# Altium schematic symbol library jlcpcb_2025_04_inductors_extended_0402.schlib: 1396 symbols (part 2 of 8)
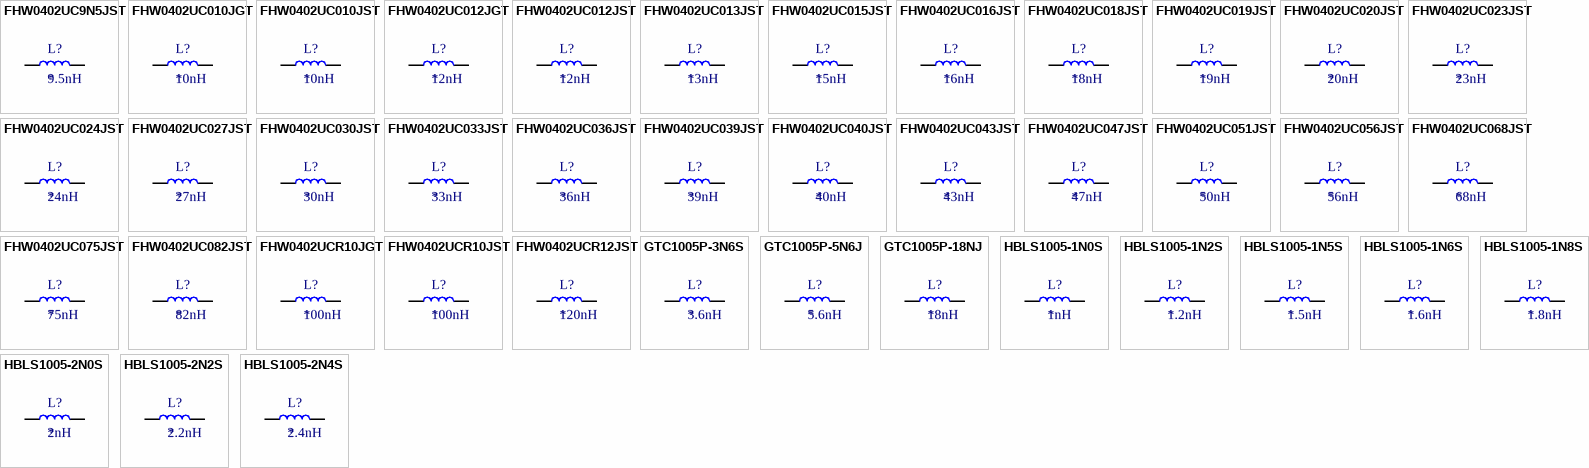
[diagram p35: symbols FHW0402UC9N5JST to HBLS1005-2N4S]

## FHW0402UC051JST
designator L?  Inductance: 50nH
Inductor, 50nH, ±5%, 820mΩ, 100mA, SMD 0402; Manufacturer: FH(Guangdong Fenghua Advanced Tech); Manufacturer Part Number: FHW0402UC051JST; Self-Resonant Frequency: 1.75GHz; Q Factor: 25@250MHz; Package Size: 0402; JLCPCB Basic Part: No; JLCPCB Part Number: C317970; Supplier 1: LCSC; Category: Inductors; Supplier Part Number 1: C317970; Tolerance: ±5%; Rated Current: 100mA; DC Resistance: 820mΩ; RoHS: Yes; ComponentLink1Description: Datasheet; ComponentLink1URL: https://wmsc.lcsc.com/wmsc/upload/file/pdf/v2/lcsc/2302231208_FH--Guangdong-Fenghua-Advanced-Tech-FHW0402UC051JST_C317970.pdf; ComponentLink2Description: JLCPCB Part URL; ComponentLink2URL: https://jlcpcb.com/partdetail/C317970; ComponentLink3Description: LCSC Part URL; ComponentLink3URL: https://lcsc.com/product-detail/Inductors-SMD_FH-Guangdong-Fenghua-Advanced-Tech-FH-Guangdong-Fenghua-Advanced-Tech-FHW0402UC051JST_C317970.html
footprint IND-0402 (0402 (1005M) Inductor)
pins: 1, 2

## FHW0402UC056JST
designator L?  Inductance: 56nH
Inductor, 56nH, ±5%, 970mΩ, 100mA, SMD 0402; Manufacturer: FH(Guangdong Fenghua Advanced Tech); Manufacturer Part Number: FHW0402UC056JST; Self-Resonant Frequency: 1.76GHz; Q Factor: 25@250MHz; Package Size: 0402; JLCPCB Basic Part: No; JLCPCB Part Number: C317971; Supplier 1: LCSC; Category: Inductors; Supplier Part Number 1: C317971; Tolerance: ±5%; Rated Current: 100mA; DC Resistance: 970mΩ; RoHS: Yes; ComponentLink1Description: Datasheet; ComponentLink1URL: https://wmsc.lcsc.com/wmsc/upload/file/pdf/v2/lcsc/2302231208_FH--Guangdong-Fenghua-Advanced-Tech-FHW0402UC056JST_C317971.pdf; ComponentLink2Description: JLCPCB Part URL; ComponentLink2URL: https://jlcpcb.com/partdetail/C317971; ComponentLink3Description: LCSC Part URL; ComponentLink3URL: https://lcsc.com/product-detail/Inductors-SMD_FH-Guangdong-Fenghua-Advanced-Tech-FH-Guangdong-Fenghua-Advanced-Tech-FHW0402UC056JST_C317971.html
footprint IND-0402 (0402 (1005M) Inductor)
pins: 1, 2

## FHW0402UC068JST
designator L?  Inductance: 68nH
Inductor, 68nH, ±5%, 1.12Ω, 100mA, SMD 0402; Manufacturer: FH(Guangdong Fenghua Advanced Tech); Manufacturer Part Number: FHW0402UC068JST; Self-Resonant Frequency: 1.62GHz; Q Factor: 25@250MHz; Package Size: 0402; JLCPCB Basic Part: No; JLCPCB Part Number: C317973; Supplier 1: LCSC; Category: Inductors; Supplier Part Number 1: C317973; Tolerance: ±5%; Rated Current: 100mA; DC Resistance: 1.12Ω; RoHS: Yes; ComponentLink1Description: Datasheet; ComponentLink1URL: https://wmsc.lcsc.com/wmsc/upload/file/pdf/v2/lcsc/2302231208_FH--Guangdong-Fenghua-Advanced-Tech-FHW0402UC068JST_C317973.pdf; ComponentLink2Description: JLCPCB Part URL; ComponentLink2URL: https://jlcpcb.com/partdetail/C317973; ComponentLink3Description: LCSC Part URL; ComponentLink3URL: https://lcsc.com/product-detail/Inductors-SMD_FH-Guangdong-Fenghua-Advanced-Tech-FH-Guangdong-Fenghua-Advanced-Tech-FHW0402UC068JST_C317973.html
footprint IND-0402 (0402 (1005M) Inductor)
pins: 1, 2

## FHW0402UC075JST
designator L?  Inductance: 75nH
Inductor, 75nH, ±5%, 1.63Ω, 50mA, SMD 0402; Manufacturer: FH(Guangdong Fenghua Advanced Tech); Manufacturer Part Number: FHW0402UC075JST; Self-Resonant Frequency: 1.4GHz; Q Factor: 25@250MHz; Package Size: 0402; JLCPCB Basic Part: No; JLCPCB Part Number: C317974; Supplier 1: LCSC; Category: Inductors; Supplier Part Number 1: C317974; Tolerance: ±5%; Rated Current: 50mA; DC Resistance: 1.63Ω; RoHS: Yes; ComponentLink1Description: Datasheet; ComponentLink1URL: https://wmsc.lcsc.com/wmsc/upload/file/pdf/v2/lcsc/2302231208_FH--Guangdong-Fenghua-Advanced-Tech-FHW0402UC075JST_C317974.pdf; ComponentLink2Description: JLCPCB Part URL; ComponentLink2URL: https://jlcpcb.com/partdetail/C317974; ComponentLink3Description: LCSC Part URL; ComponentLink3URL: https://lcsc.com/product-detail/Inductors-SMD_FH-Guangdong-Fenghua-Advanced-Tech-FH-Guangdong-Fenghua-Advanced-Tech-FHW0402UC075JST_C317974.html
footprint IND-0402 (0402 (1005M) Inductor)
pins: 1, 2

## FHW0402UC082JST
designator L?  Inductance: 82nH
Inductor, 82nH, ±5%, 1.7Ω, 50mA, SMD 0402; Manufacturer: FH(Guangdong Fenghua Advanced Tech); Manufacturer Part Number: FHW0402UC082JST; Self-Resonant Frequency: 1.26GHz; Q Factor: 25@250MHz; Package Size: 0402; JLCPCB Basic Part: No; JLCPCB Part Number: C317975; Supplier 1: LCSC; Category: Inductors; Supplier Part Number 1: C317975; Tolerance: ±5%; Rated Current: 50mA; DC Resistance: 1.7Ω; RoHS: Yes; ComponentLink1Description: Datasheet; ComponentLink1URL: https://wmsc.lcsc.com/wmsc/upload/file/pdf/v2/lcsc/2302231208_FH--Guangdong-Fenghua-Advanced-Tech-FHW0402UC082JST_C317975.pdf; ComponentLink2Description: JLCPCB Part URL; ComponentLink2URL: https://jlcpcb.com/partdetail/C317975; ComponentLink3Description: LCSC Part URL; ComponentLink3URL: https://lcsc.com/product-detail/Inductors-SMD_FH-Guangdong-Fenghua-Advanced-Tech-FH-Guangdong-Fenghua-Advanced-Tech-FHW0402UC082JST_C317975.html
footprint IND-0402 (0402 (1005M) Inductor)
pins: 1, 2

## FHW0402UCR10JGT
designator L?  Inductance: 100nH
Inductor, 100nH, ±5%, 2Ω, 30mA, SMD 0402; Manufacturer: FH(Guangdong Fenghua Advanced Tech); Manufacturer Part Number: FHW0402UCR10JGT; Self-Resonant Frequency: 1.16GHz; Q Factor: 25@250MHz; Package Size: 0402; JLCPCB Basic Part: No; JLCPCB Part Number: C316440; Supplier 1: LCSC; Category: Inductors; Supplier Part Number 1: C316440; Tolerance: ±5%; Rated Current: 30mA; DC Resistance: 2Ω; RoHS: Yes; ComponentLink1Description: Datasheet; ComponentLink1URL: https://wmsc.lcsc.com/wmsc/upload/file/pdf/v2/lcsc/2110111630_FH--Guangdong-Fenghua-Advanced-Tech-FHW0402UCR10JGT_C316440.pdf; ComponentLink2Description: JLCPCB Part URL; ComponentLink2URL: https://jlcpcb.com/partdetail/C316440; ComponentLink3Description: LCSC Part URL; ComponentLink3URL: https://lcsc.com/product-detail/Inductors-SMD_FH-Guangdong-Fenghua-Advanced-Tech-FH-Guangdong-Fenghua-Advanced-Tech-FHW0402UCR10JGT_C316440.html
footprint IND-0402 (0402 (1005M) Inductor)
pins: 1, 2

## FHW0402UCR10JST
designator L?  Inductance: 100nH
Inductor, 100nH, ±5%, 2Ω, 30mA, SMD 0402; Manufacturer: FH(Guangdong Fenghua Advanced Tech); Manufacturer Part Number: FHW0402UCR10JST; Self-Resonant Frequency: 1.16GHz; Q Factor: 25@250MHz; Package Size: 0402; JLCPCB Basic Part: No; JLCPCB Part Number: C317976; Supplier 1: LCSC; Category: Inductors; Supplier Part Number 1: C317976; Tolerance: ±5%; Rated Current: 30mA; DC Resistance: 2Ω; RoHS: Yes; ComponentLink1Description: Datasheet; ComponentLink1URL: https://wmsc.lcsc.com/wmsc/upload/file/pdf/v2/lcsc/2302231208_FH--Guangdong-Fenghua-Advanced-Tech-FHW0402UCR10JST_C317976.pdf; ComponentLink2Description: JLCPCB Part URL; ComponentLink2URL: https://jlcpcb.com/partdetail/C317976; ComponentLink3Description: LCSC Part URL; ComponentLink3URL: https://lcsc.com/product-detail/Inductors-SMD_FH-Guangdong-Fenghua-Advanced-Tech-FH-Guangdong-Fenghua-Advanced-Tech-FHW0402UCR10JST_C317976.html
footprint IND-0402 (0402 (1005M) Inductor)
pins: 1, 2

## FHW0402UCR12JST
designator L?  Inductance: 120nH
Inductor, 120nH, ±5%, 2.2Ω, 30mA, SMD 0402; Manufacturer: FH(Guangdong Fenghua Advanced Tech); Manufacturer Part Number: FHW0402UCR12JST; Self-Resonant Frequency: 1.1GHz; Q Factor: 25@250MHz; Package Size: 0402; JLCPCB Basic Part: No; JLCPCB Part Number: C317977; Supplier 1: LCSC; Category: Inductors; Supplier Part Number 1: C317977; Tolerance: ±5%; Rated Current: 30mA; DC Resistance: 2.2Ω; RoHS: Yes; ComponentLink1Description: Datasheet; ComponentLink1URL: https://wmsc.lcsc.com/wmsc/upload/file/pdf/v2/lcsc/2302231208_FH--Guangdong-Fenghua-Advanced-Tech-FHW0402UCR12JST_C317977.pdf; ComponentLink2Description: JLCPCB Part URL; ComponentLink2URL: https://jlcpcb.com/partdetail/C317977; ComponentLink3Description: LCSC Part URL; ComponentLink3URL: https://lcsc.com/product-detail/Inductors-SMD_FH-Guangdong-Fenghua-Advanced-Tech-FH-Guangdong-Fenghua-Advanced-Tech-FHW0402UCR12JST_C317977.html
footprint IND-0402 (0402 (1005M) Inductor)
pins: 1, 2

## GTC1005P-3N6S
designator L?  Inductance: 3.6nH
Inductor, 3.6nH, SMD 0402; Manufacturer: Gotrend Tech; Manufacturer Part Number: GTC1005P-3N6S; Package Size: 0402; JLCPCB Basic Part: No; JLCPCB Part Number: C226146; Supplier 1: LCSC; Category: Inductors; Supplier Part Number 1: C226146; RoHS: Yes; ComponentLink1Description: Datasheet; ComponentLink1URL: https://wmsc.lcsc.com/wmsc/upload/file/pdf/v2/lcsc/1809211933_Gotrend-Tech-GTC1005P-3N6S_C226146.pdf; ComponentLink2Description: JLCPCB Part URL; ComponentLink2URL: https://jlcpcb.com/partdetail/C226146; ComponentLink3Description: LCSC Part URL; ComponentLink3URL: https://lcsc.com/product-detail/Inductors-SMD_Gotrend-Tech-Gotrend-Tech-GTC1005P-3N6S_C226146.html
footprint IND-0402 (0402 (1005M) Inductor)
pins: 1, 2

## GTC1005P-5N6J
designator L?  Inductance: 5.6nH
Inductor, 5.6nH, ±5%, 230mΩ, 300mA, SMD 0402; Manufacturer: Gotrend Tech; Manufacturer Part Number: GTC1005P-5N6J; Package Size: 0402; JLCPCB Basic Part: No; JLCPCB Part Number: C226145; Supplier 1: LCSC; Category: Inductors; Supplier Part Number 1: C226145; Tolerance: ±5%; Rated Current: 300mA; DC Resistance: 230mΩ; RoHS: Yes; ComponentLink1Description: Datasheet; ComponentLink1URL: https://wmsc.lcsc.com/wmsc/upload/file/pdf/v2/lcsc/1809211933_Gotrend-Tech-GTC1005P-5N6J_C226145.pdf; ComponentLink2Description: JLCPCB Part URL; ComponentLink2URL: https://jlcpcb.com/partdetail/C226145; ComponentLink3Description: LCSC Part URL; ComponentLink3URL: https://lcsc.com/product-detail/Inductors-SMD_Gotrend-Tech-Gotrend-Tech-GTC1005P-5N6J_C226145.html
footprint IND-0402 (0402 (1005M) Inductor)
pins: 1, 2

## GTC1005P-18NJ
designator L?  Inductance: 18nH
Inductor, 18nH, ±5%, 550mΩ, 200mA, SMD 0402; Manufacturer: Gotrend Tech; Manufacturer Part Number: GTC1005P-18NJ; Package Size: 0402; JLCPCB Basic Part: No; JLCPCB Part Number: C226159; Supplier 1: LCSC; Category: Inductors; Supplier Part Number 1: C226159; Tolerance: ±5%; Rated Current: 200mA; DC Resistance: 550mΩ; RoHS: Yes; ComponentLink1Description: Datasheet; ComponentLink1URL: https://wmsc.lcsc.com/wmsc/upload/file/pdf/v2/lcsc/1808311639_Gotrend-Tech-GTC1005P-18NJ_C226159.pdf; ComponentLink2Description: JLCPCB Part URL; ComponentLink2URL: https://jlcpcb.com/partdetail/C226159; ComponentLink3Description: LCSC Part URL; ComponentLink3URL: https://lcsc.com/product-detail/Inductors-SMD_Gotrend-Tech-Gotrend-Tech-GTC1005P-18NJ_C226159.html
footprint IND-0402 (0402 (1005M) Inductor)
pins: 1, 2

## HBLS1005-1N0S
designator L?  Inductance: 1nH
Inductor, 1nH, 0.1Ω, 400mA, SMD 0402; Manufacturer: HYHONGYEX; Manufacturer Part Number: HBLS1005-1N0S; Self-Resonant Frequency: 10GHz; Q Factor: 8@100MHz; Package Size: 0402; JLCPCB Basic Part: No; JLCPCB Part Number: C963971; Supplier 1: LCSC; Category: Inductors; Supplier Part Number 1: C963971; Rated Current: 400mA; DC Resistance: 0.1Ω; RoHS: Yes; ComponentLink1Description: Datasheet; ComponentLink1URL: https://wmsc.lcsc.com/wmsc/upload/file/pdf/v2/lcsc/2012171915_HYHONGYEX-HBLS1005-1N0S_C963971.pdf; ComponentLink2Description: JLCPCB Part URL; ComponentLink2URL: https://jlcpcb.com/partdetail/C963971; ComponentLink3Description: LCSC Part URL; ComponentLink3URL: https://lcsc.com/product-detail/Inductors-SMD_HYHONGYEX-HYHONGYEX-HBLS1005-1N0S_C963971.html
footprint IND-0402 (0402 (1005M) Inductor)
pins: 1, 2

## HBLS1005-1N2S
designator L?  Inductance: 1.2nH
Inductor, 1.2nH, 0.1Ω, 400mA, SMD 0402; Manufacturer: HYHONGYEX; Manufacturer Part Number: HBLS1005-1N2S; Self-Resonant Frequency: 10GHz; Q Factor: 8@100MHz; Package Size: 0402; JLCPCB Basic Part: No; JLCPCB Part Number: C963973; Supplier 1: LCSC; Category: Inductors; Supplier Part Number 1: C963973; Rated Current: 400mA; DC Resistance: 0.1Ω; RoHS: Yes; ComponentLink1Description: Datasheet; ComponentLink1URL: https://wmsc.lcsc.com/wmsc/upload/file/pdf/v2/lcsc/2012171915_HYHONGYEX-HBLS1005-1N2S_C963973.pdf; ComponentLink2Description: JLCPCB Part URL; ComponentLink2URL: https://jlcpcb.com/partdetail/C963973; ComponentLink3Description: LCSC Part URL; ComponentLink3URL: https://lcsc.com/product-detail/Inductors-SMD_HYHONGYEX-HYHONGYEX-HBLS1005-1N2S_C963973.html
footprint IND-0402 (0402 (1005M) Inductor)
pins: 1, 2

## HBLS1005-1N5S
designator L?  Inductance: 1.5nH
Inductor, 1.5nH, 0.1Ω, 300mA, SMD 0402; Manufacturer: HYHONGYEX; Manufacturer Part Number: HBLS1005-1N5S; Self-Resonant Frequency: 6GHz; Q Factor: 8@100MHz; Package Size: 0402; JLCPCB Basic Part: No; JLCPCB Part Number: C963975; Supplier 1: LCSC; Category: Inductors; Supplier Part Number 1: C963975; Rated Current: 300mA; DC Resistance: 0.1Ω; RoHS: Yes; ComponentLink1Description: Datasheet; ComponentLink1URL: https://wmsc.lcsc.com/wmsc/upload/file/pdf/v2/lcsc/2012171915_HYHONGYEX-HBLS1005-1N5S_C963975.pdf; ComponentLink2Description: JLCPCB Part URL; ComponentLink2URL: https://jlcpcb.com/partdetail/C963975; ComponentLink3Description: LCSC Part URL; ComponentLink3URL: https://lcsc.com/product-detail/Inductors-SMD_HYHONGYEX-HYHONGYEX-HBLS1005-1N5S_C963975.html
footprint IND-0402 (0402 (1005M) Inductor)
pins: 1, 2

## HBLS1005-1N6S
designator L?  Inductance: 1.6nH
Inductor, 1.6nH, 0.1Ω, 300mA, SMD 0402; Manufacturer: HYHONGYEX; Manufacturer Part Number: HBLS1005-1N6S; Package Size: 0402; JLCPCB Basic Part: No; JLCPCB Part Number: C963976; Supplier 1: LCSC; Category: Inductors; Supplier Part Number 1: C963976; Rated Current: 300mA; DC Resistance: 0.1Ω; RoHS: Yes; ComponentLink1Description: Datasheet; ComponentLink1URL: https://wmsc.lcsc.com/wmsc/upload/file/pdf/v2/lcsc/2206142015_HYHONGYEX-HBLS1005-1N6S_C963976.pdf; ComponentLink2Description: JLCPCB Part URL; ComponentLink2URL: https://jlcpcb.com/partdetail/C963976; ComponentLink3Description: LCSC Part URL; ComponentLink3URL: https://lcsc.com/product-detail/Inductors-SMD_HYHONGYEX-HYHONGYEX-HBLS1005-1N6S_C963976.html
footprint IND-0402 (0402 (1005M) Inductor)
pins: 1, 2

## HBLS1005-1N8S
designator L?  Inductance: 1.8nH
Inductor, 1.8nH, 0.1Ω, 300mA, SMD 0402; Manufacturer: HYHONGYEX; Manufacturer Part Number: HBLS1005-1N8S; Self-Resonant Frequency: 6GHz; Q Factor: 8@100MHz; Package Size: 0402; JLCPCB Basic Part: No; JLCPCB Part Number: C963977; Supplier 1: LCSC; Category: Inductors; Supplier Part Number 1: C963977; Rated Current: 300mA; DC Resistance: 0.1Ω; RoHS: Yes; ComponentLink1Description: Datasheet; ComponentLink1URL: https://wmsc.lcsc.com/wmsc/upload/file/pdf/v2/lcsc/2012171915_HYHONGYEX-HBLS1005-1N8S_C963977.pdf; ComponentLink2Description: JLCPCB Part URL; ComponentLink2URL: https://jlcpcb.com/partdetail/C963977; ComponentLink3Description: LCSC Part URL; ComponentLink3URL: https://lcsc.com/product-detail/Inductors-SMD_HYHONGYEX-HYHONGYEX-HBLS1005-1N8S_C963977.html
footprint IND-0402 (0402 (1005M) Inductor)
pins: 1, 2

## HBLS1005-2N0S
designator L?  Inductance: 2nH
Inductor, 2nH, 0.2Ω, 300mA, SMD 0402; Manufacturer: HYHONGYEX; Manufacturer Part Number: HBLS1005-2N0S; Self-Resonant Frequency: 6GHz; Q Factor: 8@100MHz; Package Size: 0402; JLCPCB Basic Part: No; JLCPCB Part Number: C963978; Supplier 1: LCSC; Category: Inductors; Supplier Part Number 1: C963978; Rated Current: 300mA; DC Resistance: 0.2Ω; RoHS: Yes; ComponentLink1Description: Datasheet; ComponentLink1URL: https://wmsc.lcsc.com/wmsc/upload/file/pdf/v2/lcsc/2012171915_HYHONGYEX-HBLS1005-2N0S_C963978.pdf; ComponentLink2Description: JLCPCB Part URL; ComponentLink2URL: https://jlcpcb.com/partdetail/C963978; ComponentLink3Description: LCSC Part URL; ComponentLink3URL: https://lcsc.com/product-detail/Inductors-SMD_HYHONGYEX-HYHONGYEX-HBLS1005-2N0S_C963978.html
footprint IND-0402 (0402 (1005M) Inductor)
pins: 1, 2

## HBLS1005-2N2S
designator L?  Inductance: 2.2nH
Inductor, 2.2nH, 0.2Ω, 300mA, SMD 0402; Manufacturer: HYHONGYEX; Manufacturer Part Number: HBLS1005-2N2S; Self-Resonant Frequency: 6GHz; Q Factor: 8@100MHz; Package Size: 0402; JLCPCB Basic Part: No; JLCPCB Part Number: C963979; Supplier 1: LCSC; Category: Inductors; Supplier Part Number 1: C963979; Rated Current: 300mA; DC Resistance: 0.2Ω; RoHS: Yes; ComponentLink1Description: Datasheet; ComponentLink1URL: https://wmsc.lcsc.com/wmsc/upload/file/pdf/v2/lcsc/2012171915_HYHONGYEX-HBLS1005-2N2S_C963979.pdf; ComponentLink2Description: JLCPCB Part URL; ComponentLink2URL: https://jlcpcb.com/partdetail/C963979; ComponentLink3Description: LCSC Part URL; ComponentLink3URL: https://lcsc.com/product-detail/Inductors-SMD_HYHONGYEX-HYHONGYEX-HBLS1005-2N2S_C963979.html
footprint IND-0402 (0402 (1005M) Inductor)
pins: 1, 2

## HBLS1005-2N4S
designator L?  Inductance: 2.4nH
Inductor, 2.4nH, 0.2Ω, 300mA, SMD 0402; Manufacturer: HYHONGYEX; Manufacturer Part Number: HBLS1005-2N4S; Self-Resonant Frequency: 6GHz; Q Factor: 8@100MHz; Package Size: 0402; JLCPCB Basic Part: No; JLCPCB Part Number: C963980; Supplier 1: LCSC; Category: Inductors; Supplier Part Number 1: C963980; Rated Current: 300mA; DC Resistance: 0.2Ω; RoHS: Yes; ComponentLink1Description: Datasheet; ComponentLink1URL: https://wmsc.lcsc.com/wmsc/upload/file/pdf/v2/lcsc/2012171916_HYHONGYEX-HBLS1005-2N4S_C963980.pdf; ComponentLink2Description: JLCPCB Part URL; ComponentLink2URL: https://jlcpcb.com/partdetail/C963980; ComponentLink3Description: LCSC Part URL; ComponentLink3URL: https://lcsc.com/product-detail/Inductors-SMD_HYHONGYEX-HYHONGYEX-HBLS1005-2N4S_C963980.html
footprint IND-0402 (0402 (1005M) Inductor)
pins: 1, 2

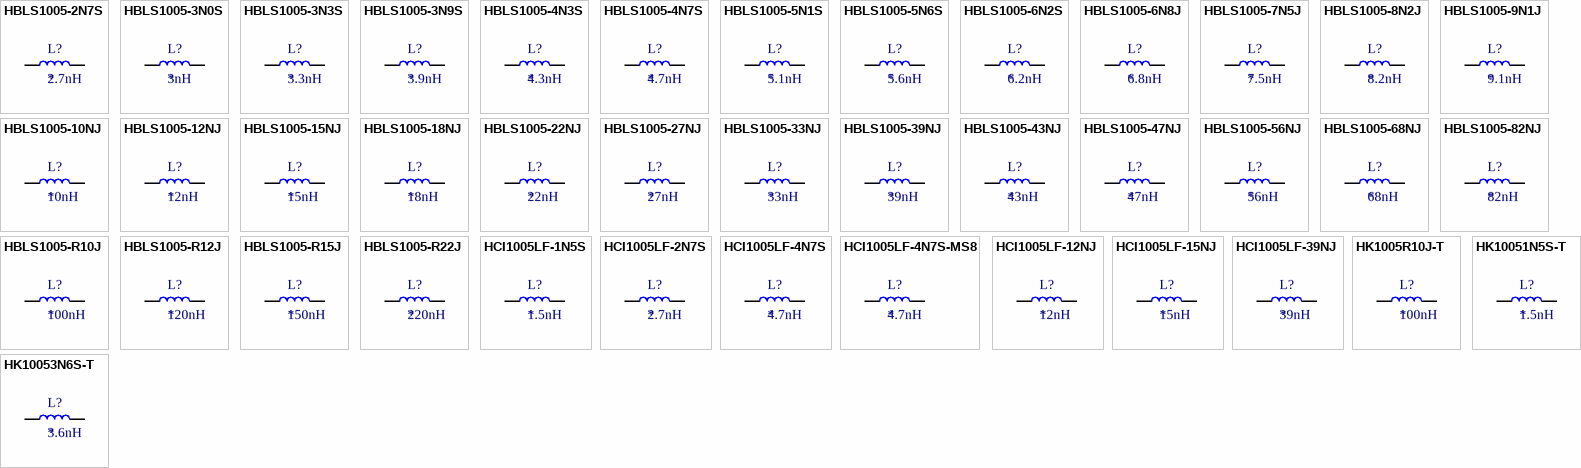
[diagram p5: symbols HBLS1005-2N7S to HK10053N6S-T]

## HBLS1005-2N7S
designator L?  Inductance: 2.7nH
Inductor, 2.7nH, 0.2Ω, 300mA, SMD 0402; Manufacturer: HYHONGYEX; Manufacturer Part Number: HBLS1005-2N7S; Self-Resonant Frequency: 6GHz; Q Factor: 8@100MHz; Package Size: 0402; JLCPCB Basic Part: No; JLCPCB Part Number: C963981; Supplier 1: LCSC; Category: Inductors; Supplier Part Number 1: C963981; Rated Current: 300mA; DC Resistance: 0.2Ω; RoHS: Yes; ComponentLink1Description: Datasheet; ComponentLink1URL: https://wmsc.lcsc.com/wmsc/upload/file/pdf/v2/lcsc/2012171916_HYHONGYEX-HBLS1005-2N7S_C963981.pdf; ComponentLink2Description: JLCPCB Part URL; ComponentLink2URL: https://jlcpcb.com/partdetail/C963981; ComponentLink3Description: LCSC Part URL; ComponentLink3URL: https://lcsc.com/product-detail/Inductors-SMD_HYHONGYEX-HYHONGYEX-HBLS1005-2N7S_C963981.html
footprint IND-0402 (0402 (1005M) Inductor)
pins: 1, 2

## HBLS1005-3N0S
designator L?  Inductance: 3nH
Inductor, 3nH, 0.2Ω, 300mA, SMD 0402; Manufacturer: HYHONGYEX; Manufacturer Part Number: HBLS1005-3N0S; Self-Resonant Frequency: 6GHz; Q Factor: 8@100MHz; Package Size: 0402; JLCPCB Basic Part: No; JLCPCB Part Number: C963982; Supplier 1: LCSC; Category: Inductors; Supplier Part Number 1: C963982; Rated Current: 300mA; DC Resistance: 0.2Ω; RoHS: Yes; ComponentLink1Description: Datasheet; ComponentLink1URL: https://wmsc.lcsc.com/wmsc/upload/file/pdf/v2/lcsc/2012171916_HYHONGYEX-HBLS1005-3N0S_C963982.pdf; ComponentLink2Description: JLCPCB Part URL; ComponentLink2URL: https://jlcpcb.com/partdetail/C963982; ComponentLink3Description: LCSC Part URL; ComponentLink3URL: https://lcsc.com/product-detail/Inductors-SMD_HYHONGYEX-HYHONGYEX-HBLS1005-3N0S_C963982.html
footprint IND-0402 (0402 (1005M) Inductor)
pins: 1, 2

## HBLS1005-3N3S
designator L?  Inductance: 3.3nH
Inductor, 3.3nH, 0.2Ω, 300mA, SMD 0402; Manufacturer: HYHONGYEX; Manufacturer Part Number: HBLS1005-3N3S; Self-Resonant Frequency: 6GHz; Q Factor: 8@100MHz; Package Size: 0402; JLCPCB Basic Part: No; JLCPCB Part Number: C963983; Supplier 1: LCSC; Category: Inductors; Supplier Part Number 1: C963983; Rated Current: 300mA; DC Resistance: 0.2Ω; RoHS: Yes; ComponentLink1Description: Datasheet; ComponentLink1URL: https://wmsc.lcsc.com/wmsc/upload/file/pdf/v2/lcsc/2012171916_HYHONGYEX-HBLS1005-3N3S_C963983.pdf; ComponentLink2Description: JLCPCB Part URL; ComponentLink2URL: https://jlcpcb.com/partdetail/C963983; ComponentLink3Description: LCSC Part URL; ComponentLink3URL: https://lcsc.com/product-detail/Inductors-SMD_HYHONGYEX-HYHONGYEX-HBLS1005-3N3S_C963983.html
footprint IND-0402 (0402 (1005M) Inductor)
pins: 1, 2

## HBLS1005-3N9S
designator L?  Inductance: 3.9nH
Inductor, 3.9nH, 0.2Ω, 300mA, SMD 0402; Manufacturer: HYHONGYEX; Manufacturer Part Number: HBLS1005-3N9S; Self-Resonant Frequency: 4GHz; Q Factor: 8@100MHz; Package Size: 0402; JLCPCB Basic Part: No; JLCPCB Part Number: C963985; Supplier 1: LCSC; Category: Inductors; Supplier Part Number 1: C963985; Rated Current: 300mA; DC Resistance: 0.2Ω; RoHS: Yes; ComponentLink1Description: Datasheet; ComponentLink1URL: https://wmsc.lcsc.com/wmsc/upload/file/pdf/v2/lcsc/2012171916_HYHONGYEX-HBLS1005-3N9S_C963985.pdf; ComponentLink2Description: JLCPCB Part URL; ComponentLink2URL: https://jlcpcb.com/partdetail/C963985; ComponentLink3Description: LCSC Part URL; ComponentLink3URL: https://lcsc.com/product-detail/Inductors-SMD_HYHONGYEX-HYHONGYEX-HBLS1005-3N9S_C963985.html
footprint IND-0402 (0402 (1005M) Inductor)
pins: 1, 2

## HBLS1005-4N3S
designator L?  Inductance: 4.3nH
Inductor, 4.3nH, 0.2Ω, 300mA, SMD 0402; Manufacturer: HYHONGYEX; Manufacturer Part Number: HBLS1005-4N3S; Self-Resonant Frequency: 4GHz; Q Factor: 8@100MHz; Package Size: 0402; JLCPCB Basic Part: No; JLCPCB Part Number: C963986; Supplier 1: LCSC; Category: Inductors; Supplier Part Number 1: C963986; Rated Current: 300mA; DC Resistance: 0.2Ω; RoHS: Yes; ComponentLink1Description: Datasheet; ComponentLink1URL: https://wmsc.lcsc.com/wmsc/upload/file/pdf/v2/lcsc/2012171916_HYHONGYEX-HBLS1005-4N3S_C963986.pdf; ComponentLink2Description: JLCPCB Part URL; ComponentLink2URL: https://jlcpcb.com/partdetail/C963986; ComponentLink3Description: LCSC Part URL; ComponentLink3URL: https://lcsc.com/product-detail/Inductors-SMD_HYHONGYEX-HYHONGYEX-HBLS1005-4N3S_C963986.html
footprint IND-0402 (0402 (1005M) Inductor)
pins: 1, 2

## HBLS1005-4N7S
designator L?  Inductance: 4.7nH
Inductor, 4.7nH, 0.2Ω, 300mA, SMD 0402; Manufacturer: HYHONGYEX; Manufacturer Part Number: HBLS1005-4N7S; Self-Resonant Frequency: 4GHz; Q Factor: 8@100MHz; Package Size: 0402; JLCPCB Basic Part: No; JLCPCB Part Number: C963987; Supplier 1: LCSC; Category: Inductors; Supplier Part Number 1: C963987; Rated Current: 300mA; DC Resistance: 0.2Ω; RoHS: Yes; ComponentLink1Description: Datasheet; ComponentLink1URL: https://wmsc.lcsc.com/wmsc/upload/file/pdf/v2/lcsc/2012171916_HYHONGYEX-HBLS1005-4N7S_C963987.pdf; ComponentLink2Description: JLCPCB Part URL; ComponentLink2URL: https://jlcpcb.com/partdetail/C963987; ComponentLink3Description: LCSC Part URL; ComponentLink3URL: https://lcsc.com/product-detail/Inductors-SMD_HYHONGYEX-HYHONGYEX-HBLS1005-4N7S_C963987.html
footprint IND-0402 (0402 (1005M) Inductor)
pins: 1, 2

## HBLS1005-5N1S
designator L?  Inductance: 5.1nH
Inductor, 5.1nH, 0.3Ω, 300mA, SMD 0402; Manufacturer: HYHONGYEX; Manufacturer Part Number: HBLS1005-5N1S; Self-Resonant Frequency: 4GHz; Q Factor: 8@100MHz; Package Size: 0402; JLCPCB Basic Part: No; JLCPCB Part Number: C963988; Supplier 1: LCSC; Category: Inductors; Supplier Part Number 1: C963988; Rated Current: 300mA; DC Resistance: 0.3Ω; RoHS: Yes; ComponentLink1Description: Datasheet; ComponentLink1URL: https://wmsc.lcsc.com/wmsc/upload/file/pdf/v2/lcsc/2012171916_HYHONGYEX-HBLS1005-5N1S_C963988.pdf; ComponentLink2Description: JLCPCB Part URL; ComponentLink2URL: https://jlcpcb.com/partdetail/C963988; ComponentLink3Description: LCSC Part URL; ComponentLink3URL: https://lcsc.com/product-detail/Inductors-SMD_HYHONGYEX-HYHONGYEX-HBLS1005-5N1S_C963988.html
footprint IND-0402 (0402 (1005M) Inductor)
pins: 1, 2

## HBLS1005-5N6S
designator L?  Inductance: 5.6nH
Inductor, 5.6nH, 0.3Ω, 300mA, SMD 0402; Manufacturer: HYHONGYEX; Manufacturer Part Number: HBLS1005-5N6S; Self-Resonant Frequency: 4GHz; Q Factor: 8@100MHz; Package Size: 0402; JLCPCB Basic Part: No; JLCPCB Part Number: C963989; Supplier 1: LCSC; Category: Inductors; Supplier Part Number 1: C963989; Rated Current: 300mA; DC Resistance: 0.3Ω; RoHS: Yes; ComponentLink1Description: Datasheet; ComponentLink1URL: https://wmsc.lcsc.com/wmsc/upload/file/pdf/v2/lcsc/2012171916_HYHONGYEX-HBLS1005-5N6S_C963989.pdf; ComponentLink2Description: JLCPCB Part URL; ComponentLink2URL: https://jlcpcb.com/partdetail/C963989; ComponentLink3Description: LCSC Part URL; ComponentLink3URL: https://lcsc.com/product-detail/Inductors-SMD_HYHONGYEX-HYHONGYEX-HBLS1005-5N6S_C963989.html
footprint IND-0402 (0402 (1005M) Inductor)
pins: 1, 2

## HBLS1005-6N2S
designator L?  Inductance: 6.2nH
Inductor, 6.2nH, 0.3Ω, 300mA, SMD 0402; Manufacturer: HYHONGYEX; Manufacturer Part Number: HBLS1005-6N2S; Self-Resonant Frequency: 3.9GHz; Q Factor: 8@100MHz; Package Size: 0402; JLCPCB Basic Part: No; JLCPCB Part Number: C963990; Supplier 1: LCSC; Category: Inductors; Supplier Part Number 1: C963990; Rated Current: 300mA; DC Resistance: 0.3Ω; RoHS: Yes; ComponentLink1Description: Datasheet; ComponentLink1URL: https://wmsc.lcsc.com/wmsc/upload/file/pdf/v2/lcsc/2012171916_HYHONGYEX-HBLS1005-6N2S_C963990.pdf; ComponentLink2Description: JLCPCB Part URL; ComponentLink2URL: https://jlcpcb.com/partdetail/C963990; ComponentLink3Description: LCSC Part URL; ComponentLink3URL: https://lcsc.com/product-detail/Inductors-SMD_HYHONGYEX-HYHONGYEX-HBLS1005-6N2S_C963990.html
footprint IND-0402 (0402 (1005M) Inductor)
pins: 1, 2

## HBLS1005-6N8J
designator L?  Inductance: 6.8nH
Inductor, 6.8nH, ±5%, 0.3Ω, 300mA, SMD 0402; Manufacturer: HYHONGYEX; Manufacturer Part Number: HBLS1005-6N8J; Self-Resonant Frequency: 3.9GHz; Q Factor: 8@100MHz; Package Size: 0402; JLCPCB Basic Part: No; JLCPCB Part Number: C963991; Supplier 1: LCSC; Category: Inductors; Supplier Part Number 1: C963991; Tolerance: ±5%; Rated Current: 300mA; DC Resistance: 0.3Ω; RoHS: Yes; ComponentLink1Description: Datasheet; ComponentLink1URL: https://wmsc.lcsc.com/wmsc/upload/file/pdf/v2/lcsc/2012171916_HYHONGYEX-HBLS1005-6N8J_C963991.pdf; ComponentLink2Description: JLCPCB Part URL; ComponentLink2URL: https://jlcpcb.com/partdetail/C963991; ComponentLink3Description: LCSC Part URL; ComponentLink3URL: https://lcsc.com/product-detail/Inductors-SMD_HYHONGYEX-HYHONGYEX-HBLS1005-6N8J_C963991.html
footprint IND-0402 (0402 (1005M) Inductor)
pins: 1, 2

## HBLS1005-7N5J
designator L?  Inductance: 7.5nH
Inductor, 7.5nH, ±5%, 0.4Ω, 300mA, SMD 0402; Manufacturer: HYHONGYEX; Manufacturer Part Number: HBLS1005-7N5J; Self-Resonant Frequency: 3.7GHz; Q Factor: 8@100MHz; Package Size: 0402; JLCPCB Basic Part: No; JLCPCB Part Number: C963992; Supplier 1: LCSC; Category: Inductors; Supplier Part Number 1: C963992; Tolerance: ±5%; Rated Current: 300mA; DC Resistance: 0.4Ω; RoHS: Yes; ComponentLink1Description: Datasheet; ComponentLink1URL: https://wmsc.lcsc.com/wmsc/upload/file/pdf/v2/lcsc/2012171916_HYHONGYEX-HBLS1005-7N5J_C963992.pdf; ComponentLink2Description: JLCPCB Part URL; ComponentLink2URL: https://jlcpcb.com/partdetail/C963992; ComponentLink3Description: LCSC Part URL; ComponentLink3URL: https://lcsc.com/product-detail/Inductors-SMD_HYHONGYEX-HYHONGYEX-HBLS1005-7N5J_C963992.html
footprint IND-0402 (0402 (1005M) Inductor)
pins: 1, 2

## HBLS1005-8N2J
designator L?  Inductance: 8.2nH
Inductor, 8.2nH, ±5%, 0.4Ω, 300mA, SMD 0402; Manufacturer: HYHONGYEX; Manufacturer Part Number: HBLS1005-8N2J; Self-Resonant Frequency: 3.6GHz; Q Factor: 8@100MHz; Package Size: 0402; JLCPCB Basic Part: No; JLCPCB Part Number: C963993; Supplier 1: LCSC; Category: Inductors; Supplier Part Number 1: C963993; Tolerance: ±5%; Rated Current: 300mA; DC Resistance: 0.4Ω; RoHS: Yes; ComponentLink1Description: Datasheet; ComponentLink1URL: https://wmsc.lcsc.com/wmsc/upload/file/pdf/v2/lcsc/2012171916_HYHONGYEX-HBLS1005-8N2J_C963993.pdf; ComponentLink2Description: JLCPCB Part URL; ComponentLink2URL: https://jlcpcb.com/partdetail/C963993; ComponentLink3Description: LCSC Part URL; ComponentLink3URL: https://lcsc.com/product-detail/Inductors-SMD_HYHONGYEX-HYHONGYEX-HBLS1005-8N2J_C963993.html
footprint IND-0402 (0402 (1005M) Inductor)
pins: 1, 2

## HBLS1005-9N1J
designator L?  Inductance: 9.1nH
Inductor, 9.1nH, ±5%, 0.4Ω, 300mA, SMD 0402; Manufacturer: HYHONGYEX; Manufacturer Part Number: HBLS1005-9N1J; Self-Resonant Frequency: 3.4GHz; Q Factor: 8@100MHz; Package Size: 0402; JLCPCB Basic Part: No; JLCPCB Part Number: C963994; Supplier 1: LCSC; Category: Inductors; Supplier Part Number 1: C963994; Tolerance: ±5%; Rated Current: 300mA; DC Resistance: 0.4Ω; RoHS: Yes; ComponentLink1Description: Datasheet; ComponentLink1URL: https://wmsc.lcsc.com/wmsc/upload/file/pdf/v2/lcsc/2012171916_HYHONGYEX-HBLS1005-9N1J_C963994.pdf; ComponentLink2Description: JLCPCB Part URL; ComponentLink2URL: https://jlcpcb.com/partdetail/C963994; ComponentLink3Description: LCSC Part URL; ComponentLink3URL: https://lcsc.com/product-detail/Inductors-SMD_HYHONGYEX-HYHONGYEX-HBLS1005-9N1J_C963994.html
footprint IND-0402 (0402 (1005M) Inductor)
pins: 1, 2

## HBLS1005-10NJ
designator L?  Inductance: 10nH
Inductor, 10nH, ±5%, 0.4Ω, 300mA, SMD 0402; Manufacturer: HYHONGYEX; Manufacturer Part Number: HBLS1005-10NJ; Self-Resonant Frequency: 3.2GHz; Q Factor: 8@100MHz; Package Size: 0402; JLCPCB Basic Part: No; JLCPCB Part Number: C963995; Supplier 1: LCSC; Category: Inductors; Supplier Part Number 1: C963995; Tolerance: ±5%; Rated Current: 300mA; DC Resistance: 0.4Ω; RoHS: Yes; ComponentLink1Description: Datasheet; ComponentLink1URL: https://wmsc.lcsc.com/wmsc/upload/file/pdf/v2/lcsc/2012171916_HYHONGYEX-HBLS1005-10NJ_C963995.pdf; ComponentLink2Description: JLCPCB Part URL; ComponentLink2URL: https://jlcpcb.com/partdetail/C963995; ComponentLink3Description: LCSC Part URL; ComponentLink3URL: https://lcsc.com/product-detail/Inductors-SMD_HYHONGYEX-HYHONGYEX-HBLS1005-10NJ_C963995.html
footprint IND-0402 (0402 (1005M) Inductor)
pins: 1, 2

## HBLS1005-12NJ
designator L?  Inductance: 12nH
Inductor, 12nH, ±5%, 0.5Ω, 300mA, SMD 0402; Manufacturer: HYHONGYEX; Manufacturer Part Number: HBLS1005-12NJ; Self-Resonant Frequency: 2.7GHz; Q Factor: 8@100MHz; Package Size: 0402; JLCPCB Basic Part: No; JLCPCB Part Number: C963996; Supplier 1: LCSC; Category: Inductors; Supplier Part Number 1: C963996; Tolerance: ±5%; Rated Current: 300mA; DC Resistance: 0.5Ω; RoHS: Yes; ComponentLink1Description: Datasheet; ComponentLink1URL: https://wmsc.lcsc.com/wmsc/upload/file/pdf/v2/lcsc/2012171916_HYHONGYEX-HBLS1005-12NJ_C963996.pdf; ComponentLink2Description: JLCPCB Part URL; ComponentLink2URL: https://jlcpcb.com/partdetail/C963996; ComponentLink3Description: LCSC Part URL; ComponentLink3URL: https://lcsc.com/product-detail/Inductors-SMD_HYHONGYEX-HYHONGYEX-HBLS1005-12NJ_C963996.html
footprint IND-0402 (0402 (1005M) Inductor)
pins: 1, 2

## HBLS1005-15NJ
designator L?  Inductance: 15nH
Inductor, 15nH, ±5%, 0.5Ω, 300mA, SMD 0402; Manufacturer: HYHONGYEX; Manufacturer Part Number: HBLS1005-15NJ; Self-Resonant Frequency: 2.3GHz; Q Factor: 8@100MHz; Package Size: 0402; JLCPCB Basic Part: No; JLCPCB Part Number: C963997; Supplier 1: LCSC; Category: Inductors; Supplier Part Number 1: C963997; Tolerance: ±5%; Rated Current: 300mA; DC Resistance: 0.5Ω; RoHS: Yes; ComponentLink1Description: Datasheet; ComponentLink1URL: https://wmsc.lcsc.com/wmsc/upload/file/pdf/v2/lcsc/2012171916_HYHONGYEX-HBLS1005-15NJ_C963997.pdf; ComponentLink2Description: JLCPCB Part URL; ComponentLink2URL: https://jlcpcb.com/partdetail/C963997; ComponentLink3Description: LCSC Part URL; ComponentLink3URL: https://lcsc.com/product-detail/Inductors-SMD_HYHONGYEX-HYHONGYEX-HBLS1005-15NJ_C963997.html
footprint IND-0402 (0402 (1005M) Inductor)
pins: 1, 2

## HBLS1005-18NJ
designator L?  Inductance: 18nH
Inductor, 18nH, ±5%, 0.6Ω, 300mA, SMD 0402; Manufacturer: HYHONGYEX; Manufacturer Part Number: HBLS1005-18NJ; Self-Resonant Frequency: 2.1GHz; Q Factor: 8@100MHz; Package Size: 0402; JLCPCB Basic Part: No; JLCPCB Part Number: C963998; Supplier 1: LCSC; Category: Inductors; Supplier Part Number 1: C963998; Tolerance: ±5%; Rated Current: 300mA; DC Resistance: 0.6Ω; RoHS: Yes; ComponentLink1Description: Datasheet; ComponentLink1URL: https://wmsc.lcsc.com/wmsc/upload/file/pdf/v2/lcsc/2012171916_HYHONGYEX-HBLS1005-18NJ_C963998.pdf; ComponentLink2Description: JLCPCB Part URL; ComponentLink2URL: https://jlcpcb.com/partdetail/C963998; ComponentLink3Description: LCSC Part URL; ComponentLink3URL: https://lcsc.com/product-detail/Inductors-SMD_HYHONGYEX-HYHONGYEX-HBLS1005-18NJ_C963998.html
footprint IND-0402 (0402 (1005M) Inductor)
pins: 1, 2

## HBLS1005-22NJ
designator L?  Inductance: 22nH
Inductor, 22nH, ±5%, 0.6Ω, 300mA, SMD 0402; Manufacturer: HYHONGYEX; Manufacturer Part Number: HBLS1005-22NJ; Self-Resonant Frequency: 1.9GHz; Q Factor: 8@100MHz; Package Size: 0402; JLCPCB Basic Part: No; JLCPCB Part Number: C964000; Supplier 1: LCSC; Category: Inductors; Supplier Part Number 1: C964000; Tolerance: ±5%; Rated Current: 300mA; DC Resistance: 0.6Ω; RoHS: Yes; ComponentLink1Description: Datasheet; ComponentLink1URL: https://wmsc.lcsc.com/wmsc/upload/file/pdf/v2/lcsc/2012171916_HYHONGYEX-HBLS1005-22NJ_C964000.pdf; ComponentLink2Description: JLCPCB Part URL; ComponentLink2URL: https://jlcpcb.com/partdetail/C964000; ComponentLink3Description: LCSC Part URL; ComponentLink3URL: https://lcsc.com/product-detail/Inductors-SMD_HYHONGYEX-HYHONGYEX-HBLS1005-22NJ_C964000.html
footprint IND-0402 (0402 (1005M) Inductor)
pins: 1, 2

## HBLS1005-27NJ
designator L?  Inductance: 27nH
Inductor, 27nH, ±5%, 0.7Ω, 300mA, SMD 0402; Manufacturer: HYHONGYEX; Manufacturer Part Number: HBLS1005-27NJ; Self-Resonant Frequency: 1.6GHz; Q Factor: 8@100MHz; Package Size: 0402; JLCPCB Basic Part: No; JLCPCB Part Number: C964001; Supplier 1: LCSC; Category: Inductors; Supplier Part Number 1: C964001; Tolerance: ±5%; Rated Current: 300mA; DC Resistance: 0.7Ω; RoHS: Yes; ComponentLink1Description: Datasheet; ComponentLink1URL: https://wmsc.lcsc.com/wmsc/upload/file/pdf/v2/lcsc/2012171916_HYHONGYEX-HBLS1005-27NJ_C964001.pdf; ComponentLink2Description: JLCPCB Part URL; ComponentLink2URL: https://jlcpcb.com/partdetail/C964001; ComponentLink3Description: LCSC Part URL; ComponentLink3URL: https://lcsc.com/product-detail/Inductors-SMD_HYHONGYEX-HYHONGYEX-HBLS1005-27NJ_C964001.html
footprint IND-0402 (0402 (1005M) Inductor)
pins: 1, 2

## HBLS1005-33NJ
designator L?  Inductance: 33nH
Inductor, 33nH, ±5%, 0.8Ω, 200mA, SMD 0402; Manufacturer: HYHONGYEX; Manufacturer Part Number: HBLS1005-33NJ; Self-Resonant Frequency: 1.3GHz; Q Factor: 8@100MHz; Package Size: 0402; JLCPCB Basic Part: No; JLCPCB Part Number: C964002; Supplier 1: LCSC; Category: Inductors; Supplier Part Number 1: C964002; Tolerance: ±5%; Rated Current: 200mA; DC Resistance: 0.8Ω; RoHS: Yes; ComponentLink1Description: Datasheet; ComponentLink1URL: https://wmsc.lcsc.com/wmsc/upload/file/pdf/v2/lcsc/2012171916_HYHONGYEX-HBLS1005-33NJ_C964002.pdf; ComponentLink2Description: JLCPCB Part URL; ComponentLink2URL: https://jlcpcb.com/partdetail/C964002; ComponentLink3Description: LCSC Part URL; ComponentLink3URL: https://lcsc.com/product-detail/Inductors-SMD_HYHONGYEX-HYHONGYEX-HBLS1005-33NJ_C964002.html
footprint IND-0402 (0402 (1005M) Inductor)
pins: 1, 2

## HBLS1005-39NJ
designator L?  Inductance: 39nH
Inductor, 39nH, ±5%, 1Ω, 200mA, SMD 0402; Manufacturer: HYHONGYEX; Manufacturer Part Number: HBLS1005-39NJ; Self-Resonant Frequency: 1.2GHz; Q Factor: 8@100MHz; Package Size: 0402; JLCPCB Basic Part: No; JLCPCB Part Number: C964003; Supplier 1: LCSC; Category: Inductors; Supplier Part Number 1: C964003; Tolerance: ±5%; Rated Current: 200mA; DC Resistance: 1Ω; RoHS: Yes; ComponentLink1Description: Datasheet; ComponentLink1URL: https://wmsc.lcsc.com/wmsc/upload/file/pdf/v2/lcsc/2012171916_HYHONGYEX-HBLS1005-39NJ_C964003.pdf; ComponentLink2Description: JLCPCB Part URL; ComponentLink2URL: https://jlcpcb.com/partdetail/C964003; ComponentLink3Description: LCSC Part URL; ComponentLink3URL: https://lcsc.com/product-detail/Inductors-SMD_HYHONGYEX-HYHONGYEX-HBLS1005-39NJ_C964003.html
footprint IND-0402 (0402 (1005M) Inductor)
pins: 1, 2

## HBLS1005-43NJ
designator L?  Inductance: 43nH
Inductor, 43nH, ±5%, 1.1Ω, 200mA, SMD 0402; Manufacturer: HYHONGYEX; Manufacturer Part Number: HBLS1005-43NJ; Self-Resonant Frequency: 1.1GHz; Q Factor: 8@100MHz; Package Size: 0402; JLCPCB Basic Part: No; JLCPCB Part Number: C964004; Supplier 1: LCSC; Category: Inductors; Supplier Part Number 1: C964004; Tolerance: ±5%; Rated Current: 200mA; DC Resistance: 1.1Ω; RoHS: Yes; ComponentLink1Description: Datasheet; ComponentLink1URL: https://wmsc.lcsc.com/wmsc/upload/file/pdf/v2/lcsc/2012171916_HYHONGYEX-HBLS1005-43NJ_C964004.pdf; ComponentLink2Description: JLCPCB Part URL; ComponentLink2URL: https://jlcpcb.com/partdetail/C964004; ComponentLink3Description: LCSC Part URL; ComponentLink3URL: https://lcsc.com/product-detail/Inductors-SMD_HYHONGYEX-HYHONGYEX-HBLS1005-43NJ_C964004.html
footprint IND-0402 (0402 (1005M) Inductor)
pins: 1, 2

## HBLS1005-47NJ
designator L?  Inductance: 47nH
Inductor, 47nH, ±5%, 1.1Ω, 200mA, SMD 0402; Manufacturer: HYHONGYEX; Manufacturer Part Number: HBLS1005-47NJ; Self-Resonant Frequency: 1GHz; Q Factor: 8@100MHz; Package Size: 0402; JLCPCB Basic Part: No; JLCPCB Part Number: C964005; Supplier 1: LCSC; Category: Inductors; Supplier Part Number 1: C964005; Tolerance: ±5%; Rated Current: 200mA; DC Resistance: 1.1Ω; RoHS: Yes; ComponentLink1Description: Datasheet; ComponentLink1URL: https://wmsc.lcsc.com/wmsc/upload/file/pdf/v2/lcsc/2012171916_HYHONGYEX-HBLS1005-47NJ_C964005.pdf; ComponentLink2Description: JLCPCB Part URL; ComponentLink2URL: https://jlcpcb.com/partdetail/C964005; ComponentLink3Description: LCSC Part URL; ComponentLink3URL: https://lcsc.com/product-detail/Inductors-SMD_HYHONGYEX-HYHONGYEX-HBLS1005-47NJ_C964005.html
footprint IND-0402 (0402 (1005M) Inductor)
pins: 1, 2

## HBLS1005-56NJ
designator L?  Inductance: 56nH
Inductor, 56nH, ±5%, 1.2Ω, 200mA, SMD 0402; Manufacturer: HYHONGYEX; Manufacturer Part Number: HBLS1005-56NJ; Self-Resonant Frequency: 750MHz; Q Factor: 8@100MHz; Package Size: 0402; JLCPCB Basic Part: No; JLCPCB Part Number: C964006; Supplier 1: LCSC; Category: Inductors; Supplier Part Number 1: C964006; Tolerance: ±5%; Rated Current: 200mA; DC Resistance: 1.2Ω; RoHS: Yes; ComponentLink1Description: Datasheet; ComponentLink1URL: https://wmsc.lcsc.com/wmsc/upload/file/pdf/v2/lcsc/2012171917_HYHONGYEX-HBLS1005-56NJ_C964006.pdf; ComponentLink2Description: JLCPCB Part URL; ComponentLink2URL: https://jlcpcb.com/partdetail/C964006; ComponentLink3Description: LCSC Part URL; ComponentLink3URL: https://lcsc.com/product-detail/Inductors-SMD_HYHONGYEX-HYHONGYEX-HBLS1005-56NJ_C964006.html
footprint IND-0402 (0402 (1005M) Inductor)
pins: 1, 2

## HBLS1005-68NJ
designator L?  Inductance: 68nH
Inductor, 68nH, ±5%, 1.4Ω, 180mA, SMD 0402; Manufacturer: HYHONGYEX; Manufacturer Part Number: HBLS1005-68NJ; Self-Resonant Frequency: 750MHz; Q Factor: 8@100MHz; Package Size: 0402; JLCPCB Basic Part: No; JLCPCB Part Number: C964007; Supplier 1: LCSC; Category: Inductors; Supplier Part Number 1: C964007; Tolerance: ±5%; Rated Current: 180mA; DC Resistance: 1.4Ω; RoHS: Yes; ComponentLink1Description: Datasheet; ComponentLink1URL: https://wmsc.lcsc.com/wmsc/upload/file/pdf/v2/lcsc/2012171917_HYHONGYEX-HBLS1005-68NJ_C964007.pdf; ComponentLink2Description: JLCPCB Part URL; ComponentLink2URL: https://jlcpcb.com/partdetail/C964007; ComponentLink3Description: LCSC Part URL; ComponentLink3URL: https://lcsc.com/product-detail/Inductors-SMD_HYHONGYEX-HYHONGYEX-HBLS1005-68NJ_C964007.html
footprint IND-0402 (0402 (1005M) Inductor)
pins: 1, 2

## HBLS1005-82NJ
designator L?  Inductance: 82nH
Inductor, 82nH, ±5%, 2.4Ω, 150mA, SMD 0402; Manufacturer: HYHONGYEX; Manufacturer Part Number: HBLS1005-82NJ; Self-Resonant Frequency: 750MHz; Q Factor: 8@100MHz; Package Size: 0402; JLCPCB Basic Part: No; JLCPCB Part Number: C964008; Supplier 1: LCSC; Category: Inductors; Supplier Part Number 1: C964008; Tolerance: ±5%; Rated Current: 150mA; DC Resistance: 2.4Ω; RoHS: Yes; ComponentLink1Description: Datasheet; ComponentLink1URL: https://wmsc.lcsc.com/wmsc/upload/file/pdf/v2/lcsc/2012171917_HYHONGYEX-HBLS1005-82NJ_C964008.pdf; ComponentLink2Description: JLCPCB Part URL; ComponentLink2URL: https://jlcpcb.com/partdetail/C964008; ComponentLink3Description: LCSC Part URL; ComponentLink3URL: https://lcsc.com/product-detail/Inductors-SMD_HYHONGYEX-HYHONGYEX-HBLS1005-82NJ_C964008.html
footprint IND-0402 (0402 (1005M) Inductor)
pins: 1, 2

## HBLS1005-R10J
designator L?  Inductance: 100nH
Inductor, 100nH, ±5%, 2.6Ω, 150mA, SMD 0402; Manufacturer: HYHONGYEX; Manufacturer Part Number: HBLS1005-R10J; Self-Resonant Frequency: 700MHz; Q Factor: 8@100MHz; Package Size: 0402; JLCPCB Basic Part: No; JLCPCB Part Number: C964009; Supplier 1: LCSC; Category: Inductors; Supplier Part Number 1: C964009; Tolerance: ±5%; Rated Current: 150mA; DC Resistance: 2.6Ω; RoHS: Yes; ComponentLink1Description: Datasheet; ComponentLink1URL: https://wmsc.lcsc.com/wmsc/upload/file/pdf/v2/lcsc/2012171917_HYHONGYEX-HBLS1005-R10J_C964009.pdf; ComponentLink2Description: JLCPCB Part URL; ComponentLink2URL: https://jlcpcb.com/partdetail/C964009; ComponentLink3Description: LCSC Part URL; ComponentLink3URL: https://lcsc.com/product-detail/Inductors-SMD_HYHONGYEX-HYHONGYEX-HBLS1005-R10J_C964009.html
footprint IND-0402 (0402 (1005M) Inductor)
pins: 1, 2
